# Altium footprint library terminal_blocks.PcbLib: 74 footprints (part 2 of 5)
Each footprint in its own frame and in the unit in brackets; x right, y up, seen from the top. Pads: shape width x height; smd on the part's side, far side on the other; paste and mask are expansions set on the pad; w line width, h text height; cw(c..) or ccw(c..) is an arc to the next point about the centre after c.
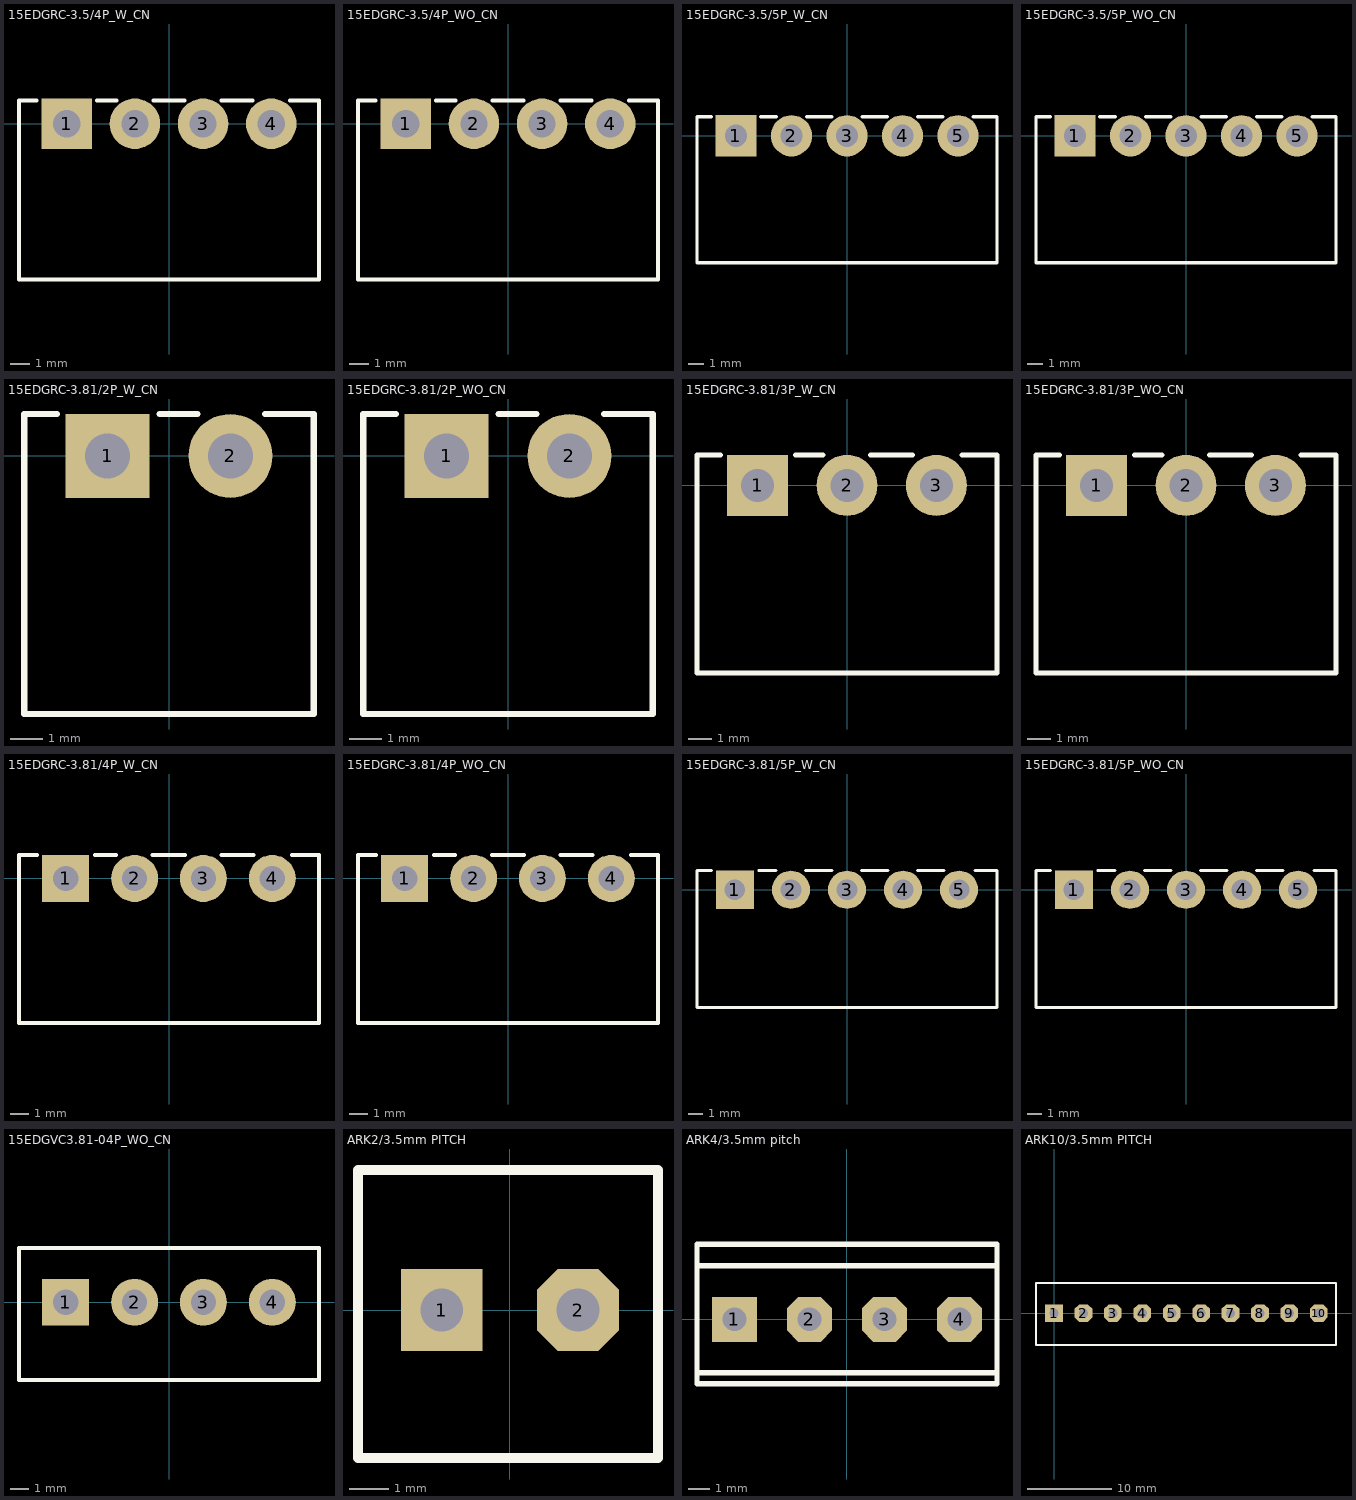
[diagram p1: the footprints below, top view; thin cyan lines are the x and y axes]

## 15EDGRC-3.5/4P_W_CN [mm] "Degson 7A, 250V, 4 Pole Plug-in Terminal Block"
height 7
pads (4):
  rect 2.6x2.6 hole 1.4: 1(-5.25,0)
  round 2.6 hole 1.4: 2(-1.75,0) 3(1.75,0) 4(5.25,0)
Top Overlay:
  lines w0.2: -6.8,1.2 -7.7,1.2 -7.7,-8 7.7,-8 7.7,1.2 6.2,1.2 ; -3.7,1.2 -2.7,1.2 ; -0.8,1.2 0.8,1.2 ; 2.7,1.2 4.3,1.2
3D body "1840382.STEP": height 9.15, standoff -3.4, extent -7.7,-17.456 7.7,1.2

## 15EDGRC-3.5/4P_WO_CN [mm] "Degson 7A, 250V, 4 Pole Plug-in Terminal Block"
height 7
pads (4):
  rect 2.6x2.6 hole 1.4: 1(-5.25,0)
  round 2.6 hole 1.4: 2(-1.75,0) 3(1.75,0) 4(5.25,0)
Top Overlay:
  lines w0.2: -6.8,1.2 -7.7,1.2 -7.7,-8 7.7,-8 7.7,1.2 6.2,1.2 ; -3.7,1.2 -2.7,1.2 ; -0.8,1.2 0.8,1.2 ; 2.7,1.2 4.3,1.2
3D body "1844236_05.stp": height 7.25, standoff -3.4, extent -7.7,-8 7.7,1.2

## 15EDGRC-3.5/5P_W_CN [mm] "Degson 7A, 250V, 5 Pole Plug-in Terminal Block"
height 7
pads (5):
  rect 2.6x2.6 hole 1.4: 1(-7,0)
  round 2.6 hole 1.4: 2(-3.5,0) 3(0,0) 4(3.5,0) 5(7,0)
Top Overlay:
  lines w0.2: -8.55,1.2 -9.45,1.2 -9.45,-8 9.45,-8 9.45,1.2 7.95,1.2 ; -5.45,1.2 -4.45,1.2 ; -2.55,1.2 -0.95,1.2 ; 0.95,1.2 2.55,1.2 ; 4.45,1.2 6.05,1.2
3D body "1840395.STEP": height 9.15, standoff -3.4, extent -9.45,-17.527 9.45,1.2

## 15EDGRC-3.5/5P_WO_CN [mm] "Degson 7A, 250V, 5 Pole Plug-in Terminal Block"
height 7
pads (5):
  rect 2.6x2.6 hole 1.4: 1(-7,0)
  round 2.6 hole 1.4: 2(-3.5,0) 3(0,0) 4(3.5,0) 5(7,0)
Top Overlay:
  lines w0.2: -8.55,1.2 -9.45,1.2 -9.45,-8 9.45,-8 9.45,1.2 7.95,1.2 ; -5.45,1.2 -4.45,1.2 ; -2.55,1.2 -0.95,1.2 ; 0.95,1.2 2.55,1.2 ; 4.45,1.2 6.05,1.2
3D body "1844249.stp": height 7.25, standoff -3.4, extent -9.45,-8 9.45,1.2

## 15EDGRC-3.81/2P_W_CN [mm] "Degson 7A, 250V, 2 Pole Plug-in Terminal Block"
height 7
pads (2):
  rect 2.6x2.6 hole 1.4: 1(-1.905,0)
  round 2.6 hole 1.4: 2(1.905,0)
Top Overlay:
  lines w0.2: -3.485,1.3 -4.49,1.3 -4.49,-8 4.49,-8 4.49,1.3 2.985,1.3 ; -0.29,1.3 0.88,1.3
3D body "2_pin_w_conector.STEP": height 7.75, standoff -3.4, extent -4.505,-17.5 4.505,1.3

## 15EDGRC-3.81/2P_WO_CN [mm] "Degson 7A, 250V, 2 Pole Plug-in Terminal Block"
height 7
pads (2):
  rect 2.6x2.6 hole 1.4: 1(-1.905,0)
  round 2.6 hole 1.4: 2(1.905,0)
Top Overlay:
  lines w0.2: -3.485,1.3 -4.49,1.3 -4.49,-8 4.49,-8 4.49,1.3 2.985,1.3 ; -0.29,1.3 0.88,1.3
3D body "1803277.stp": height 7.25, standoff -3.4, extent -4.505,-8 4.505,1.3

## 15EDGRC-3.81/3P_W_CN [mm] "Degson 7A, 250V, 3 Pole Plug-in Terminal Block"
height 7
pads (3):
  rect 2.6x2.6 hole 1.4: 1(-3.81,0)
  round 2.6 hole 1.4: 2(0,0) 3(3.81,0)
Top Overlay:
  lines w0.2: -5.39,1.3 -6.395,1.3 -6.395,-8 6.395,-8 6.395,1.3 4.89,1.3 ; -2.195,1.3 -1.025,1.3 ; 1.005,1.3 2.805,1.3
3D body "3_pin_w_conector.STEP": height 7.8, standoff -3.35, extent -6.41,-17.5 6.41,1.3

## 15EDGRC-3.81/3P_WO_CN [mm] "Degson 7A, 250V, 3 Pole Plug-in Terminal Block"
height 7
pads (3):
  rect 2.6x2.6 hole 1.4: 1(-3.81,0)
  round 2.6 hole 1.4: 2(0,0) 3(3.81,0)
Top Overlay:
  lines w0.2: -5.39,1.3 -6.395,1.3 -6.395,-8 6.395,-8 6.395,1.3 4.89,1.3 ; -2.195,1.3 -1.025,1.3 ; 1.005,1.3 2.805,1.3
3D body "1803280.stp": height 7.25, standoff -3.4, extent -6.41,-8 6.41,1.3

## 15EDGRC-3.81/4P_W_CN [mm] "Degson 7A, 250V, 4 Pole Plug-in Terminal Block"
height 7
pads (4):
  rect 2.6x2.6 hole 1.4: 1(-5.715,0)
  round 2.6 hole 1.4: 2(-1.905,0) 3(1.905,0) 4(5.715,0)
Top Overlay:
  lines w0.2: -7.295,1.3 -8.3,1.3 -8.3,-8 8.3,-8 8.3,1.3 6.795,1.3 ; -4.095,1.3 -2.925,1.3 ; -0.915,1.3 0.885,1.3 ; 2.895,1.3 4.695,1.3
3D body "4_pin_w_conector.STEP": height 7.85, standoff -3.4, extent -8.33,-17.5 8.3,1.3

## 15EDGRC-3.81/4P_WO_CN [mm] "Degson 7A, 250V, 4 Pole Plug-in Terminal Block"
height 7
pads (4):
  rect 2.6x2.6 hole 1.4: 1(-5.715,0)
  round 2.6 hole 1.4: 2(-1.905,0) 3(1.905,0) 4(5.715,0)
Top Overlay:
  lines w0.2: -7.295,1.3 -8.3,1.3 -8.3,-8 8.3,-8 8.3,1.3 6.795,1.3 ; -4.1,1.3 -2.93,1.3 ; -0.9,1.3 0.9,1.3 ; 2.9,1.3 4.7,1.3
3D body "1803293.stp": height 7.25, standoff -3.4, extent -8.315,-7.996 8.315,1.3

## 15EDGRC-3.81/5P_W_CN [mm] "Degson 7A, 250V, 5 Pole Plug-in Terminal Block"
height 7
pads (5):
  rect 2.6x2.6 hole 1.4: 1(-7.62,0)
  round 2.6 hole 1.4: 2(-3.81,0) 3(0,0) 4(3.81,0) 5(7.62,0)
Top Overlay:
  lines w0.2: -9.2,1.3 -10.2,1.3 -10.2,-8 10.2,-8 10.2,1.3 8.7,1.3 ; -6,1.3 -4.83,1.3 ; -2.82,1.3 -1.02,1.3 ; 0.99,1.3 2.79,1.3 ; 4.8,1.3 6.6,1.3
3D body "5_pin_w_conector.STEP": height 7.75, standoff -3.4, extent -10.22,-17.6 10.22,1.2

## 15EDGRC-3.81/5P_WO_CN [mm] "Degson 7A, 250V, 5 Pole Plug-in Terminal Block"
height 7
pads (5):
  rect 2.6x2.6 hole 1.4: 1(-7.62,0)
  round 2.6 hole 1.4: 2(-3.81,0) 3(0,0) 4(3.81,0) 5(7.62,0)
Top Overlay:
  lines w0.2: -9.2,1.3 -10.2,1.3 -10.2,-8 10.2,-8 10.2,1.3 8.7,1.3 ; -6,1.3 -4.83,1.3 ; -2.82,1.3 -1.02,1.3 ; 0.99,1.3 2.79,1.3 ; 4.8,1.3 6.6,1.3
3D body "1803303.stp": height 7.25, standoff -3.4, extent -10.22,-8 10.22,1.3

## 15EDGVC3.81-04P_WO_CN [mm]
pads (4):
  rect 2.6x2.6 hole 1.4: 1(-5.715,0)
  round 2.6 hole 1.4: 2(-1.905,0) 3(1.905,0) 4(5.715,0)
Top Overlay:
  lines w0.2: -8.3,-4.3 -8.3,3 8.3,3 8.3,-4.3 -8.3,-4.3
3D body "1803442.stp": height 9.2, standoff -3.4, extent -8.315,-4.25 8.315,3

## ARK2/3.5mm PITCH [mm]
pads (2):
  rect 2.1x2.1 hole 1.1: 1(-1.75,0)
  oct 2.1x2.1 hole 1.1: 2(1.75,0)
Top Overlay:
  lines w0.254: -3.9,-3.8 -3.9,3.6 3.8,3.6 3.8,-3.8 -3.9,-3.8
3D body "1751248.stp": height 8.5, standoff -3.5, extent -3.8,-3.75 3.7,3.55

## ARK4/3.5mm pitch [mm]
pads (4):
  rect 2.1x2.1 hole 1.1: 1(-5.25,0)
  oct 2.1x2.1 hole 1.1: 2(-1.75,0) 3(1.75,0) 4(5.25,0)
Top Overlay:
  lines w0.254: -7,-2.5 7,-2.5 ; -7,2.5 7,2.5 ; -7,-3 -7,3.5 7,3.5 7,-3 -7,-3
3D body "1751248.stp": height 8.5, standoff -3.5, extent -7.3,-3.75 0.2,3.55

## ARK10/3.5mm PITCH [mm]
pads (10):
  rect 2.1x2.1 hole 1.1: 1(0,0)
  oct 2.1x2.1 hole 1.1: 2(3.5,0) 3(7,0) 4(10.5,0) 5(14,0) 6(17.5,0) 7(21,0) 8(24.5,0) 9(28,0) 10(31.5,0)
Top Overlay:
  lines w0.254: 33.5,3.6 -2.15,3.6 -2.15,-3.8 33.55,-3.8 33.55,3.6